# Altium footprint library 400389.PcbLib: 113 footprints (part 5 of 8)
Each footprint in its own frame and in the unit in brackets; x right, y up, seen from the top. Pads: shape width x height; smd on the part's side, far side on the other; paste and mask are expansions set on the pad; w line width, h text height; cw(c..) or ccw(c..) is an arc to the next point about the centre after c.
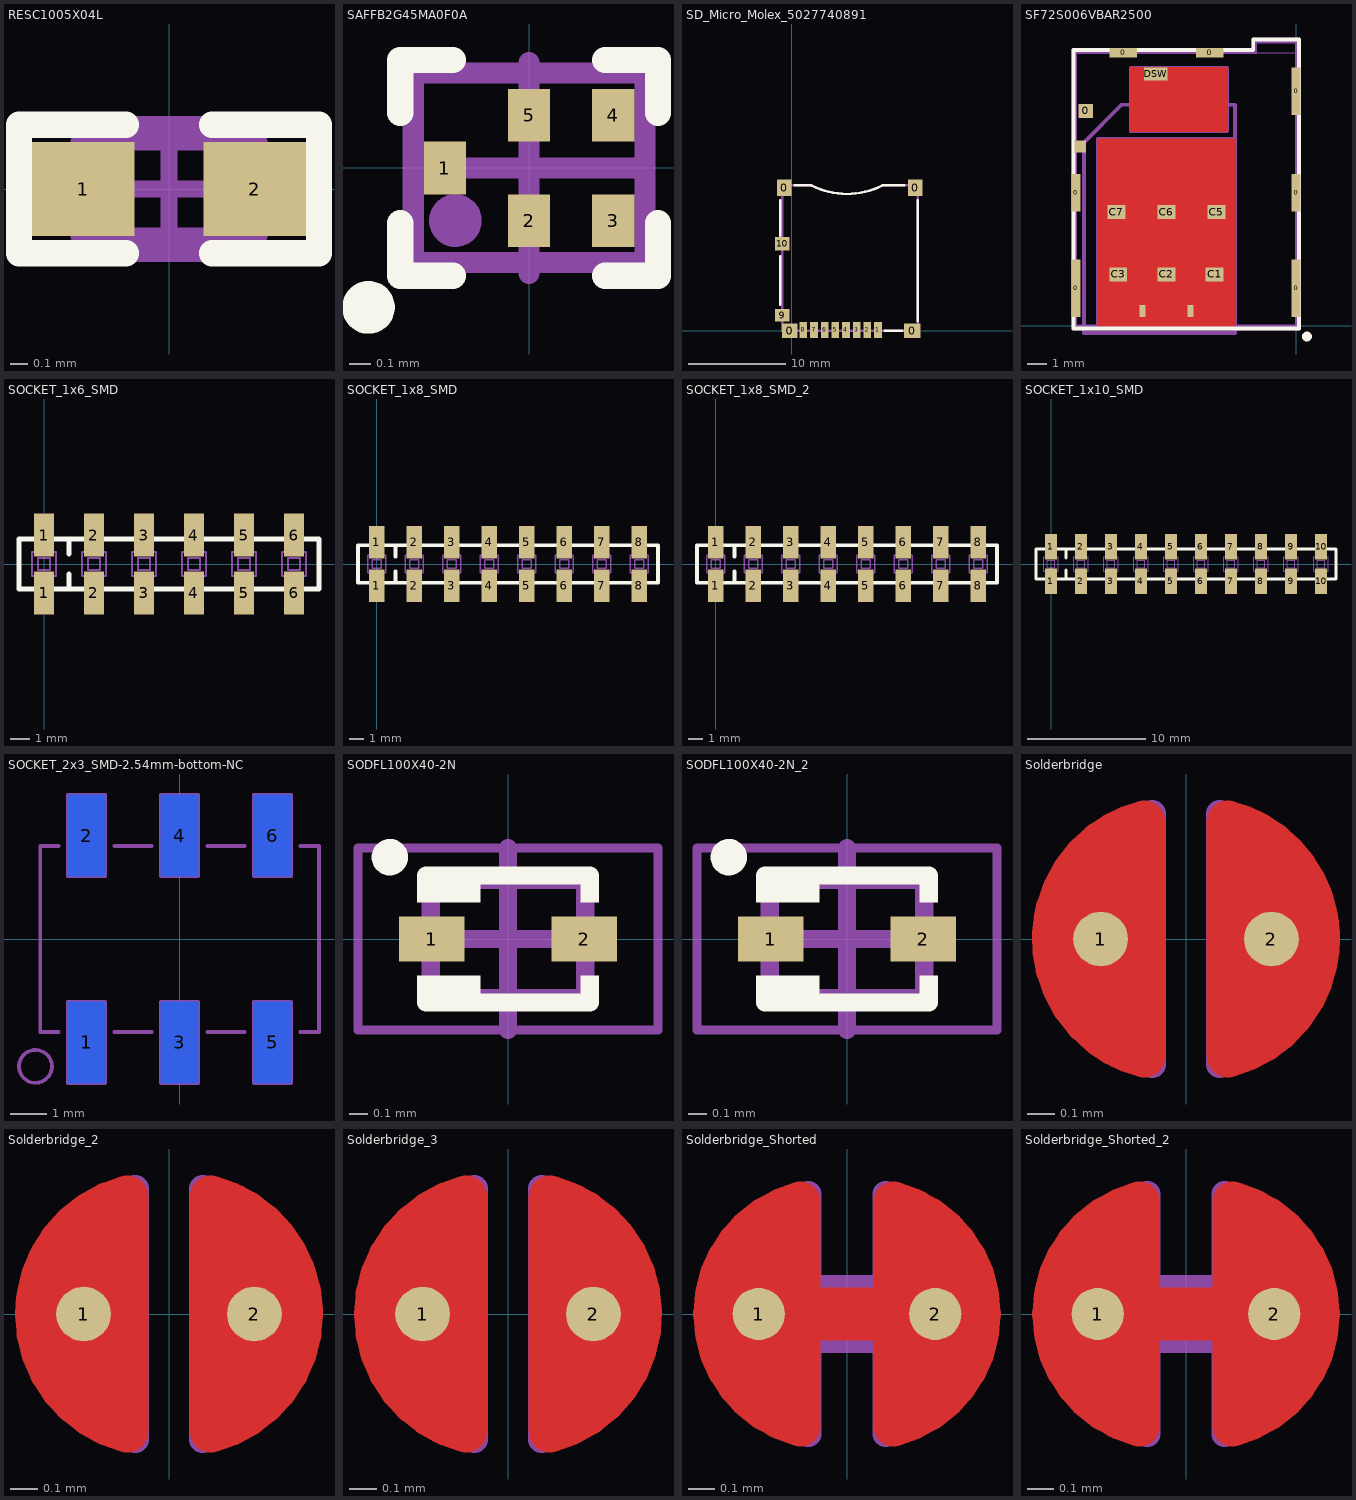
[diagram p4: the footprints below, top view; thin cyan lines are the x and y axes]

## RESC1005X04L [mm]
pads (2):
  rect 0.6x0.55 smd: 1(-0.5,0) 2(0.5,0)
Top Overlay:
  lines w0.152: -0.25,-0.375 -0.875,-0.375 -0.875,0.375 -0.25,0.375 ; 0.25,-0.375 0.875,-0.375 0.875,0.375 0.25,0.375
Mechanical 7:
  lines w0.1: -0.525,-0.275 -0.525,0.275 0.525,0.275 0.525,-0.275 -0.525,-0.275
  text ".Designator" at -0.432,-0.152 h0.3
Mechanical 15:
  lines w0.1: -0.275,0 0.275,0 ; 0,-0.275 0,0.275 ; -0.875,-0.375 0.875,-0.375 0.875,0.375 -0.875,0.375 -0.875,-0.375
3D body "User Library-res0402-1.step": height 0.3, standoff 0, extent -0.5,-0.25 0.5,0.25

## SAFFB2G45MA0F0A [mm]
pads (5):
  rect 0.2x0.25 smd: 1(-0.4,0) 2(0,-0.25) 3(0.4,-0.25) 4(0.4,0.25) 5(0,0.25)
Top Overlay:
  circle w0.15: c-0.762,-0.662 r0.05
  lines w0.125: -0.613,-0.262 -0.613,-0.512 -0.362,-0.512 ; -0.613,0.262 -0.613,0.512 -0.362,0.512 ; 0.362,-0.512 0.613,-0.512 0.613,-0.262 ; 0.362,0.512 0.613,0.512 0.613,0.262
Mechanical 7:
  circle w0.15: c-0.35,-0.25 r0.05
  lines w0.1: -0.55,-0.45 -0.55,0.45 0.55,0.45 0.55,-0.45 -0.55,-0.45
  text ".Designator" at -0.4,0 h0.3
Mechanical 15:
  lines w0.05: -0.55,-0.45 0.55,-0.45 0.55,0.45 -0.55,0.45 -0.55,-0.45
  lines w0.1: -0.5,0 0.5,0 ; 0,-0.5 0,0.5
3D body: height 0.5, standoff 0, extent -0.55,-0.45 0.55,0.45

## SD_Micro_Molex_5027740891 [mm]
pads (14):
  rect 1.5x1.7 smd: 0(-0.75,14.77) 0(12.75,14.77)
  rect 1.6x1.5 smd: 0(-0.21,0)
  rect 1.7x1.5 smd: 0(12.45,0)
  rect 0.8x1.68 smd: 1(8.9,0.08) 2(7.8,0.08) 3(6.7,0.08) 4(5.6,0.08) 5(4.5,0.08) 6(3.4,0.08) 7(2.3,0.08) 8(1.2,0.08)
  rect 1.5x1.3 smd: 9(-0.96,1.6)
  rect 1.5x1.4 smd: 10(-0.96,8.97)
Top Overlay:
  lines w0.254: -1.2,2.7 -1.2,7.7 ; -1.2,9.8 -1.2,13.5 ; 0.3,14.999 2,15 ; 2.091,14.981 ccw(c5.705,22.118) 9.311,14.977 ; 9.4,15 11.6,15 ; 9.6,0 11.4,0 ; 13,1 13,13.5
Mechanical 7:
  lines w0.254: 2.072,15 -1,15 -1,0 13,0 13,15 9.334,15 ; 2.091,14.981 ccw(c5.705,22.118) 9.311,14.977
  text ".designator" at 3.8,6.9 h1.52

## SF72S006VBAR2500 [mm]
pads (18):
  rect 0.45x2.9 smd: 0(-11.175,1.9) 0(0,1.9)
  rect 0.45x1.9 smd: 0(-11.175,6.75) 0(0,6.75)
  rect 0.75x0.7 smd: 0(-10.675,10.9)
  rect 1.4x0.5 smd: 0(-8.78,13.85) 0(-4.38,13.85)
  rect 0.3x0.6 smd: 0(-7.8,0.75) 0(-5.36,0.75)
  rect 0.45x2.4 smd: 0(0,11.9)
  rect 0.9x0.7 smd: C1(-4.14,2.6) C2(-6.58,2.6) C3(-9.02,2.6) C5(-4.04,5.77) C6(-6.58,5.77) C7(-9.12,5.77)
  rect 0.6x0.6 smd: CSW(-10.95,9.1)
  rect 1.2x0.65 smd: DSW(-7.13,12.775)
Top Layer:
  pour cut-out: -8.407,13.106 -3.48,13.106 -3.48,9.855 -8.407,9.855
  pour cut-out: -10.084,9.5 -3.073,9.5 -3.073,-0.025 -10.084,-0.025
Top Overlay:
  lines w0.2: -11.3,-0.15 0.15,-0.15 0.15,14.525 -2.175,14.525 -2.175,14 -11.3,14 -11.3,-0.15
  lines w0.25: 0.443,-0.486 ccw(c0.55,-0.55) 0.462,-0.462
Mechanical 7:
  lines w0.2: -3.124,11.214 -8.852,11.214 -10.77,9.296 -10.77,-0.381 -3.099,-0.381 -3.099,11.214 ; -11.3,-0.15 -11.3,14 -2.175,14 -2.175,14.525 0.15,14.525 0.15,-0.15 -11.3,-0.15
  text ".Designator" at -10.414,12.192 h1.02
Mechanical 13:
  lines w0.1: -11.175,0 0,0 0,14.375 -2.025,14.375 -2.025,13.85 -11.175,13.85 -11.175,0
Mechanical 15:
  lines w0.05: -11.175,0 0,0 0,13.85 -11.175,13.85 -11.175,0
  lines w0.15: -5.16,0 -10.08,0 -10.08,9.5 -3.08,9.5 -3.08,0 ; -8.4,9.85 -8.4,13.1 -3.48,13.1 -3.48,9.85 -8.4,9.85
  text "NO VIA" at -8.128,11.938 h0.8
  text "NO VIA" at -8.93,7.84 h0.8
  text "NO TRACE" at -8.89,10.668 h0.8
  text "NO TRACE" at -9.652,6.604 h0.8
3D body "K3D-SF72S006VBA-V2_JAE_Proprietary.STEP": height 1.25, standoff 0, extent -11.2,0.05 0.02,14.4

## SOCKET_1x6_SMD [mm]
pads (12):
  rect 1.02x2.19 smd: 1(0,-1.465) 1(0,1.465) 2(2.54,-1.465) 2(2.54,1.465) 3(5.08,-1.465) 3(5.08,1.465) 4(7.62,-1.465) 4(7.62,1.465) 5(10.16,-1.465) 5(10.16,1.465) 6(12.7,1.465) 6(12.7,-1.465)
Top Overlay:
  lines w0.254: 1.27,-1.27 1.27,-0.508 ; 1.27,0.508 1.27,1.27 ; -1.27,-1.27 13.97,-1.27 13.97,1.27 -1.27,1.27 -1.27,-1.27
Mechanical 7:
  lines w0.1: -0.35,-1.27 -0.35,-1.812 ccw(c0,-1.812) 0.35,-1.812 0.35,-1.27 ; 2.19,1.27 2.19,1.812 cw(c2.54,1.812) 2.89,1.812 2.89,1.27 ; 4.73,-1.27 4.73,-1.812 ccw(c5.08,-1.812) 5.43,-1.812 5.43,-1.27 ; 7.27,1.27 7.27,1.812 cw(c7.62,1.812) 7.97,1.812 7.97,1.27 ; 9.81,-1.27 9.81,-1.812 ccw(c10.16,-1.812) 10.51,-1.812 10.51,-1.27 ; 12.35,1.27 12.35,1.812 cw(c12.7,1.812) 13.05,1.812 13.05,1.27 ; -1.27,-1.27 -1.27,1.27 13.97,1.27 13.97,-1.27 -1.27,-1.27 ; -0.6,-0.6 -0.6,0.6 0.6,0.6 0.6,-0.6 -0.6,-0.6 ; -0.3,-0.3 -0.3,0.3 0.3,0.3 0.3,-0.3 -0.3,-0.3 ; 1.94,-0.6 1.94,0.6 3.14,0.6 3.14,-0.6 1.94,-0.6 ; 2.24,-0.3 2.24,0.3 2.84,0.3 2.84,-0.3 2.24,-0.3 ; 4.48,-0.6 4.48,0.6 5.68,0.6 5.68,-0.6 4.48,-0.6 ; 4.78,-0.3 4.78,0.3 5.38,0.3 5.38,-0.3 4.78,-0.3 ; 7.02,-0.6 7.02,0.6 8.22,0.6 8.22,-0.6 7.02,-0.6 ; 7.32,-0.3 7.32,0.3 7.92,0.3 7.92,-0.3 7.32,-0.3 ; 9.56,-0.6 9.56,0.6 10.76,0.6 10.76,-0.6 9.56,-0.6 ; 9.86,-0.3 9.86,0.3 10.46,0.3 10.46,-0.3 9.86,-0.3 ; 12.1,-0.6 12.1,0.6 13.3,0.6 13.3,-0.6 12.1,-0.6 ; 12.4,-0.3 12.4,0.3 13,0.3 13,-0.3 12.4,-0.3
  text ".Designator" at 0.77,-0.2 h0.38
3D body "Samtec-SSM-106-L-SV.step": height 7.47, standoff -0.03, extent -1.27,-2.286 13.97,2.286

## SOCKET_1x8_SMD [mm]
pads (16):
  rect 1.02x2.19 smd: 1(0,-1.465) 1(0,1.465) 2(2.54,-1.465) 2(2.54,1.465) 3(5.08,-1.465) 3(5.08,1.465) 4(7.62,-1.465) 4(7.62,1.465) 5(10.16,-1.465) 5(10.16,1.465) 6(12.7,1.465) 6(12.7,-1.465) 7(15.24,-1.465) 7(15.24,1.465) 8(17.78,-1.465) 8(17.78,1.465)
Top Overlay:
  lines w0.254: 1.27,-1.27 1.27,-0.508 ; 1.27,0.508 1.27,1.27 ; -1.27,-1.27 19.05,-1.27 19.05,1.27 -1.27,1.27 -1.27,-1.27
Mechanical 7:
  lines w0.1: -0.35,-1.27 -0.35,-1.812 ccw(c0,-1.812) 0.35,-1.812 0.35,-1.27 ; 2.19,1.27 2.19,1.812 cw(c2.54,1.812) 2.89,1.812 2.89,1.27 ; 4.73,-1.27 4.73,-1.812 ccw(c5.08,-1.812) 5.43,-1.812 5.43,-1.27 ; 7.27,1.27 7.27,1.812 cw(c7.62,1.812) 7.97,1.812 7.97,1.27 ; 9.81,-1.27 9.81,-1.812 ccw(c10.16,-1.812) 10.51,-1.812 10.51,-1.27 ; 12.35,1.27 12.35,1.812 cw(c12.7,1.812) 13.05,1.812 13.05,1.27 ; 14.89,-1.27 14.89,-1.812 ccw(c15.24,-1.812) 15.59,-1.812 15.59,-1.27 ; 17.43,1.27 17.43,1.812 cw(c17.78,1.812) 18.13,1.812 18.13,1.27 ; -1.27,-1.27 19.05,-1.27 19.05,1.27 -1.27,1.27 -1.27,-1.27 ; -0.6,-0.6 0.6,-0.6 0.6,0.6 -0.6,0.6 -0.6,-0.6 ; -0.3,-0.3 0.3,-0.3 0.3,0.3 -0.3,0.3 -0.3,-0.3 ; 1.94,-0.6 3.14,-0.6 3.14,0.6 1.94,0.6 1.94,-0.6 ; 2.24,-0.3 2.84,-0.3 2.84,0.3 2.24,0.3 2.24,-0.3 ; 4.48,-0.6 5.68,-0.6 5.68,0.6 4.48,0.6 4.48,-0.6 ; 4.78,-0.3 5.38,-0.3 5.38,0.3 4.78,0.3 4.78,-0.3 ; 7.02,-0.6 8.22,-0.6 8.22,0.6 7.02,0.6 7.02,-0.6 ; 7.32,-0.3 7.92,-0.3 7.92,0.3 7.32,0.3 7.32,-0.3 ; 9.56,-0.6 10.76,-0.6 10.76,0.6 9.56,0.6 9.56,-0.6 ; 9.86,-0.3 10.46,-0.3 10.46,0.3 9.86,0.3 9.86,-0.3 ; 12.1,-0.6 13.3,-0.6 13.3,0.6 12.1,0.6 12.1,-0.6 ; 12.4,-0.3 13,-0.3 13,0.3 12.4,0.3 12.4,-0.3 ; 14.64,-0.6 15.84,-0.6 15.84,0.6 14.64,0.6 14.64,-0.6 ; 14.94,-0.3 15.54,-0.3 15.54,0.3 14.94,0.3 14.94,-0.3 ; 17.18,-0.6 18.38,-0.6 18.38,0.6 17.18,0.6 17.18,-0.6 ; 17.48,-0.3 18.08,-0.3 18.08,0.3 17.48,0.3 17.48,-0.3
  text ".Designator" at 0.77,-0.2 h0.38
3D body "Samtec-SSM-108-L-SV.step": height 7.47, standoff -0.03, extent -1.27,-2.286 19.05,2.286

## SOCKET_1x8_SMD_2 [mm]
pads (16):
  rect 1.02x2.19 smd: 1(0,-1.465) 1(0,1.465) 2(2.54,-1.465) 2(2.54,1.465) 3(5.08,-1.465) 3(5.08,1.465) 4(7.62,-1.465) 4(7.62,1.465) 5(10.16,-1.465) 5(10.16,1.465) 6(12.7,1.465) 6(12.7,-1.465) 7(15.24,-1.465) 7(15.24,1.465) 8(17.78,-1.465) 8(17.78,1.465)
Top Overlay:
  lines w0.254: 1.27,-1.27 1.27,-0.508 ; 1.27,0.508 1.27,1.27 ; -1.27,-1.27 19.05,-1.27 19.05,1.27 -1.27,1.27 -1.27,-1.27
Mechanical 7:
  lines w0.1: -0.35,-1.27 -0.35,-1.812 ccw(c0,-1.812) 0.35,-1.812 0.35,-1.27 ; 2.19,1.27 2.19,1.812 cw(c2.54,1.812) 2.89,1.812 2.89,1.27 ; 4.73,-1.27 4.73,-1.812 ccw(c5.08,-1.812) 5.43,-1.812 5.43,-1.27 ; 7.27,1.27 7.27,1.812 cw(c7.62,1.812) 7.97,1.812 7.97,1.27 ; 9.81,-1.27 9.81,-1.812 ccw(c10.16,-1.812) 10.51,-1.812 10.51,-1.27 ; 12.35,1.27 12.35,1.812 cw(c12.7,1.812) 13.05,1.812 13.05,1.27 ; 14.89,-1.27 14.89,-1.812 ccw(c15.24,-1.812) 15.59,-1.812 15.59,-1.27 ; 17.43,1.27 17.43,1.812 cw(c17.78,1.812) 18.13,1.812 18.13,1.27 ; -1.27,-1.27 19.05,-1.27 19.05,1.27 -1.27,1.27 -1.27,-1.27 ; -0.6,-0.6 0.6,-0.6 0.6,0.6 -0.6,0.6 -0.6,-0.6 ; -0.3,-0.3 0.3,-0.3 0.3,0.3 -0.3,0.3 -0.3,-0.3 ; 1.94,-0.6 3.14,-0.6 3.14,0.6 1.94,0.6 1.94,-0.6 ; 2.24,-0.3 2.84,-0.3 2.84,0.3 2.24,0.3 2.24,-0.3 ; 4.48,-0.6 5.68,-0.6 5.68,0.6 4.48,0.6 4.48,-0.6 ; 4.78,-0.3 5.38,-0.3 5.38,0.3 4.78,0.3 4.78,-0.3 ; 7.02,-0.6 8.22,-0.6 8.22,0.6 7.02,0.6 7.02,-0.6 ; 7.32,-0.3 7.92,-0.3 7.92,0.3 7.32,0.3 7.32,-0.3 ; 9.56,-0.6 10.76,-0.6 10.76,0.6 9.56,0.6 9.56,-0.6 ; 9.86,-0.3 10.46,-0.3 10.46,0.3 9.86,0.3 9.86,-0.3 ; 12.1,-0.6 13.3,-0.6 13.3,0.6 12.1,0.6 12.1,-0.6 ; 12.4,-0.3 13,-0.3 13,0.3 12.4,0.3 12.4,-0.3 ; 14.64,-0.6 15.84,-0.6 15.84,0.6 14.64,0.6 14.64,-0.6 ; 14.94,-0.3 15.54,-0.3 15.54,0.3 14.94,0.3 14.94,-0.3 ; 17.18,-0.6 18.38,-0.6 18.38,0.6 17.18,0.6 17.18,-0.6 ; 17.48,-0.3 18.08,-0.3 18.08,0.3 17.48,0.3 17.48,-0.3
  text ".Designator" at 0.77,-0.2 h0.38
3D body "Samtec-SSM-108-L-SV.step": height 7.47, standoff -0.03, extent -1.27,-2.286 19.05,2.286

## SOCKET_1x10_SMD [mm]
pads (20):
  rect 1.02x2.19 smd: 1(0,-1.465) 1(0,1.465) 2(2.54,-1.465) 2(2.54,1.465) 3(5.08,-1.465) 3(5.08,1.465) 4(7.62,-1.465) 4(7.62,1.465) 5(10.16,-1.465) 5(10.16,1.465) 6(12.7,-1.465) 6(12.7,1.465) 7(15.24,-1.465) 7(15.24,1.465) 8(17.78,-1.465) 8(17.78,1.465) 9(20.32,-1.465) 9(20.32,1.465) 10(22.86,-1.465) 10(22.86,1.465)
Top Overlay:
  lines w0.254: 1.27,-1.27 1.27,-0.508 ; 1.27,0.508 1.27,1.27 ; -1.27,-1.27 24.13,-1.27 24.13,1.27 -1.27,1.27 -1.27,-1.27
Mechanical 7:
  lines w0.1: -0.35,-1.27 -0.35,-1.812 ccw(c0,-1.812) 0.35,-1.812 0.35,-1.27 ; 2.19,1.27 2.19,1.812 cw(c2.54,1.812) 2.89,1.812 2.89,1.27 ; 4.73,-1.27 4.73,-1.812 ccw(c5.08,-1.812) 5.43,-1.812 5.43,-1.27 ; 7.27,1.27 7.27,1.812 cw(c7.62,1.812) 7.97,1.812 7.97,1.27 ; 9.81,-1.27 9.81,-1.812 ccw(c10.16,-1.812) 10.51,-1.812 10.51,-1.27 ; 12.35,1.27 12.35,1.812 cw(c12.7,1.812) 13.05,1.812 13.05,1.27 ; 14.89,-1.27 14.89,-1.812 ccw(c15.24,-1.812) 15.59,-1.812 15.59,-1.27 ; 17.43,1.27 17.43,1.812 cw(c17.78,1.812) 18.13,1.812 18.13,1.27 ; 19.97,-1.27 19.97,-1.812 ccw(c20.32,-1.812) 20.67,-1.812 20.67,-1.27 ; 22.51,1.27 22.51,1.812 cw(c22.86,1.812) 23.21,1.812 23.21,1.27 ; -1.27,-1.27 -1.27,1.27 24.13,1.27 24.13,-1.27 -1.27,-1.27 ; -0.6,-0.6 -0.6,0.6 0.6,0.6 0.6,-0.6 -0.6,-0.6 ; -0.3,-0.3 -0.3,0.3 0.3,0.3 0.3,-0.3 -0.3,-0.3 ; 1.94,-0.6 1.94,0.6 3.14,0.6 3.14,-0.6 1.94,-0.6 ; 2.24,-0.3 2.24,0.3 2.84,0.3 2.84,-0.3 2.24,-0.3 ; 4.48,-0.6 4.48,0.6 5.68,0.6 5.68,-0.6 4.48,-0.6 ; 4.78,-0.3 4.78,0.3 5.38,0.3 5.38,-0.3 4.78,-0.3 ; 7.02,-0.6 7.02,0.6 8.22,0.6 8.22,-0.6 7.02,-0.6 ; 7.32,-0.3 7.32,0.3 7.92,0.3 7.92,-0.3 7.32,-0.3 ; 9.56,-0.6 9.56,0.6 10.76,0.6 10.76,-0.6 9.56,-0.6 ; 9.86,-0.3 9.86,0.3 10.46,0.3 10.46,-0.3 9.86,-0.3 ; 12.1,-0.6 12.1,0.6 13.3,0.6 13.3,-0.6 12.1,-0.6 ; 12.4,-0.3 12.4,0.3 13,0.3 13,-0.3 12.4,-0.3 ; 14.64,-0.6 14.64,0.6 15.84,0.6 15.84,-0.6 14.64,-0.6 ; 14.94,-0.3 14.94,0.3 15.54,0.3 15.54,-0.3 14.94,-0.3 ; 17.18,-0.6 17.18,0.6 18.38,0.6 18.38,-0.6 17.18,-0.6 ; 17.48,-0.3 17.48,0.3 18.08,0.3 18.08,-0.3 17.48,-0.3 ; 19.72,-0.6 19.72,0.6 20.92,0.6 20.92,-0.6 19.72,-0.6 ; 20.02,-0.3 20.02,0.3 20.62,0.3 20.62,-0.3 20.02,-0.3 ; 22.26,-0.6 22.26,0.6 23.46,0.6 23.46,-0.6 22.26,-0.6 ; 22.56,-0.3 22.56,0.3 23.16,0.3 23.16,-0.3 22.56,-0.3
  text ".Designator" at 0.77,-0.2 h0.38
3D body "Samtec-SSM-110-L-SV.step": height 7.47, standoff -0.03, extent -1.27,-2.286 24.13,2.286

## SOCKET_2x3_SMD-2.54mm-bottom-NC [mm]
pads (6):
  rect 1.02x2.22 smd far side: 1(-2.54,-2.825) 2(-2.54,2.825) 3(0,-2.825) 4(0,2.825) 5(2.54,-2.825) 6(2.54,2.825)
Bottom Overlay:
  circle w0.508: c-3.936,-3.48 r0.254
  lines w0.254: -3.33,-2.54 -3.81,-2.54 -3.81,2.54 -3.33,2.54 ; -1.77,-2.54 -0.78,-2.54 ; -1.77,2.54 -0.78,2.54 ; 0.78,-2.54 1.77,-2.54 ; 0.78,2.54 1.77,2.54 ; 3.33,-2.54 3.81,-2.54 3.81,2.54 3.33,2.54
Mechanical 8:
  circle w0.1: c-3.936,-3.48 r0.45
  lines w0.1: -3.302,-2.54 -3.81,-2.54 -3.81,2.54 -3.302,2.54 ; -1.778,-2.54 -0.762,-2.54 ; -1.778,2.54 -0.762,2.54 ; 0.762,-2.54 1.778,-2.54 ; 0.762,2.54 1.778,2.54 ; 3.302,-2.54 3.81,-2.54 3.81,2.54 3.302,2.54 ; -3.05,-3.935 -2.03,-3.935 -2.03,-1.715 -3.05,-1.715 -3.05,-3.935 ; -3.05,1.715 -3.05,3.935 -2.03,3.935 -2.03,1.715 -3.05,1.715 ; -0.51,-3.935 0.51,-3.935 0.51,-1.715 -0.51,-1.715 -0.51,-3.935 ; -0.51,1.715 0.51,1.715 0.51,3.935 -0.51,3.935 -0.51,1.715 ; 2.03,-3.935 3.05,-3.935 3.05,-1.715 2.03,-1.715 2.03,-3.935 ; 2.03,1.715 3.05,1.715 3.05,3.935 2.03,3.935 2.03,1.715
  text ".Designator" at -3.226,0.178 h0.38

## SODFL100X40-2N [mm]
pads (2):
  rect 0.36x0.25 smd: 1(-0.42,0) 2(0.42,0)
Top Overlay:
  circle w0.1: c-0.65,0.45 r0.05
  rectangle: -0.5,0.2 -0.15,0.325
  rectangle: -0.5,-0.35 -0.15,-0.2
  rectangle: 0.4,-0.35 0.5,-0.2
  rectangle: 0.4,0.2 0.5,0.35
  lines w0.1: -0.45,-0.3 -0.45,-0.35 0.45,-0.35 0.45,-0.3 ; -0.45,0.3 -0.45,0.35 0.45,0.35 0.45,0.3
Mechanical 7:
  lines w0.1: -0.425,-0.325 0.425,-0.325 0.425,0.325 -0.425,0.325 -0.425,-0.325
  text ".Designator" at -0.724,-0.177 h0.38
Mechanical 15:
  lines w0.05: -0.825,-0.5 -0.825,0.5 0.825,0.5 0.825,-0.5 -0.825,-0.5
  lines w0.1: -0.5,0 0.5,0 ; 0,-0.5 0,0.5
3D body "SODFL100X40-2N.step": height 0.4, standoff 0, extent -0.5,-0.325 0.5,0.325

## SODFL100X40-2N_2 [mm]
pads (2):
  rect 0.36x0.25 smd: 1(-0.42,0) 2(0.42,0)
Top Overlay:
  circle w0.1: c-0.65,0.45 r0.05
  rectangle: -0.5,0.2 -0.15,0.325
  rectangle: -0.5,-0.35 -0.15,-0.2
  rectangle: 0.4,-0.35 0.5,-0.2
  rectangle: 0.4,0.2 0.5,0.35
  lines w0.1: -0.45,-0.3 -0.45,-0.35 0.45,-0.35 0.45,-0.3 ; -0.45,0.3 -0.45,0.35 0.45,0.35 0.45,0.3
Mechanical 7:
  lines w0.1: -0.425,-0.325 0.425,-0.325 0.425,0.325 -0.425,0.325 -0.425,-0.325
  text ".Designator" at -0.724,-0.177 h0.38
Mechanical 15:
  lines w0.05: -0.825,-0.5 -0.825,0.5 0.825,0.5 0.825,-0.5 -0.825,-0.5
  lines w0.1: -0.5,0 0.5,0 ; 0,-0.5 0,0.5
3D body "SODFL100X40-2N.step": height 0.4, standoff 0, extent -0.5,-0.325 0.5,0.325

## Solderbridge [mm]
pads (2):
  round 0.2 smd paste-10: 1(-0.312,0) 2(0.312,0)
Top Layer:
  region: -0.077,-0.432 -0.152,-0.505 -0.271,-0.467 -0.335,-0.424 -0.409,-0.351 -0.462,-0.292 -0.521,-0.193 -0.549,-0.099 -0.544,0.122 -0.518,0.193 -0.434,0.33 -0.351,0.411 -0.259,0.469 -0.157,0.5 -0.107,0.483 -0.077,0.43
  region: 0.077,0.432 0.152,0.505 0.271,0.467 0.335,0.424 0.409,0.351 0.462,0.292 0.521,0.193 0.549,0.099 0.544,-0.122 0.518,-0.193 0.434,-0.33 0.351,-0.411 0.259,-0.469 0.157,-0.5 0.107,-0.483 0.077,-0.43
  lines w0.152: -0.153,-0.431 cw(c-0.042,0) -0.313,-0.353 cw(c-0.042,0) -0.473,-0.109 cw(c-0.042,0) -0.487,0.017 cw(c-0.042,0) -0.473,0.109 cw(c-0.042,0) -0.312,0.353 cw(c-0.042,0) -0.153,0.431 ; 0.153,-0.431 ccw(c0.042,0) 0.479,-0.085 ccw(c0.042,0) 0.487,0 ccw(c0.042,0) 0.487,0.017 ccw(c0.042,0) 0.479,0.085 ccw(c0.042,0) 0.312,0.353 ccw(c0.042,0) 0.153,0.431
Top Solder:
  circle w0.61: c-0.003,0 r0.279
Mechanical 7:
  lines w0.1: -0.123,-0.459 cw(c-0.042,0) -0.123,0.459 -0.123,-0.459 ; 0.123,-0.459 ccw(c0.042,0) 0.123,0.459 0.123,-0.459
  text ".Designator" at -0.635,0.635 h0.38

## Solderbridge_2 [mm]
pads (2):
  round 0.2 smd paste-10: 1(-0.312,0) 2(0.312,0)
Top Layer:
  region: -0.077,-0.432 -0.152,-0.505 -0.271,-0.467 -0.335,-0.424 -0.409,-0.351 -0.462,-0.292 -0.521,-0.193 -0.549,-0.099 -0.544,0.122 -0.518,0.193 -0.434,0.33 -0.351,0.411 -0.259,0.469 -0.157,0.5 -0.107,0.483 -0.077,0.43
  region: 0.077,0.432 0.152,0.505 0.271,0.467 0.335,0.424 0.409,0.351 0.462,0.292 0.521,0.193 0.549,0.099 0.544,-0.122 0.518,-0.193 0.434,-0.33 0.351,-0.411 0.259,-0.469 0.157,-0.5 0.107,-0.483 0.077,-0.43
  lines w0.152: -0.153,-0.431 cw(c-0.042,0) -0.487,0 cw(c-0.042,0) -0.482,0.064 cw(c-0.042,0) -0.153,0.431 ; 0.153,-0.431 ccw(c0.042,0) 0.487,0 ccw(c0.042,0) 0.487,0.011 ccw(c0.042,0) 0.153,0.431
Top Solder:
  circle w0.61: c-0.003,0 r0.279
Mechanical 7:
  lines w0.1: -0.123,-0.459 cw(c-0.042,0) -0.123,0.459 -0.123,-0.459 ; 0.123,-0.459 ccw(c0.042,0) 0.123,0.459 0.123,-0.459
  text ".Designator" at -0.635,0.635 h0.38

## Solderbridge_3 [mm]
pads (2):
  round 0.2 smd paste-10: 1(-0.312,0) 2(0.312,0)
Top Layer:
  region: 0.077,0.432 0.152,0.505 0.271,0.467 0.335,0.424 0.409,0.351 0.462,0.292 0.521,0.193 0.549,0.099 0.544,-0.122 0.518,-0.193 0.434,-0.33 0.351,-0.411 0.259,-0.469 0.157,-0.5 0.107,-0.483 0.077,-0.43
  region: -0.077,-0.432 -0.152,-0.505 -0.271,-0.467 -0.335,-0.424 -0.409,-0.351 -0.462,-0.292 -0.521,-0.193 -0.549,-0.099 -0.544,0.122 -0.518,0.193 -0.434,0.33 -0.351,0.411 -0.259,0.469 -0.157,0.5 -0.107,0.483 -0.077,0.43
  lines w0.152: -0.153,-0.431 cw(c-0.042,0) -0.487,0 cw(c-0.042,0) -0.153,0.431 ; 0.153,-0.431 ccw(c0.042,0) 0.468,-0.13 ccw(c0.042,0) 0.153,0.431
Top Solder:
  circle w0.61: c-0.003,0 r0.279
Mechanical 7:
  lines w0.1: -0.123,-0.459 cw(c-0.042,0) -0.123,0.459 -0.123,-0.459 ; 0.123,-0.459 ccw(c0.042,0) 0.123,0.459 0.123,-0.459
  text ".Designator" at -0.635,0.635 h0.38

## Solderbridge_Shorted [mm]
pads (2):
  round 0.2 smd paste-10: 1(-0.338,0) 2(0.338,0)
Top Layer:
  region: 0.102,0.432 0.178,0.505 0.296,0.467 0.361,0.424 0.434,0.351 0.488,0.292 0.546,0.193 0.574,0.099 0.569,-0.122 0.544,-0.193 0.46,-0.33 0.376,-0.411 0.284,-0.469 0.183,-0.5 0.132,-0.483 0.102,-0.43
  region: -0.102,-0.432 -0.178,-0.505 -0.296,-0.467 -0.361,-0.424 -0.434,-0.351 -0.488,-0.292 -0.546,-0.193 -0.574,-0.099 -0.569,0.122 -0.544,0.193 -0.46,0.33 -0.376,0.411 -0.284,0.469 -0.183,0.5 -0.132,0.483 -0.102,0.43
  lines w0.152: -0.178,-0.431 cw(c-0.068,0) -0.178,0.431 ; 0.178,-0.431 ccw(c0.068,0) 0.178,0.431
  lines w0.203: -0.338,0 0.338,0
Top Solder:
  circle w0.61: c-0.028,0 r0.279
  circle w0.61: c0.028,0 r0.279
Mechanical 7:
  lines w0.1: -0.148,-0.459 cw(c-0.067,0) -0.148,0.459 -0.148,0.1 0.148,0.1 0.148,0.459 cw(c0.067,0) 0.148,-0.459 0.148,-0.1 -0.148,-0.1 -0.148,-0.459
  text ".Designator" at -0.635,0.635 h0.38

## Solderbridge_Shorted_2 [mm]
pads (2):
  round 0.2 smd paste-10: 1(-0.338,0) 2(0.338,0)
Top Layer:
  region: 0.102,0.432 0.178,0.505 0.296,0.467 0.361,0.424 0.434,0.351 0.488,0.292 0.546,0.193 0.574,0.099 0.569,-0.122 0.544,-0.193 0.46,-0.33 0.376,-0.411 0.284,-0.469 0.183,-0.5 0.132,-0.483 0.102,-0.43
  region: -0.102,-0.432 -0.178,-0.505 -0.296,-0.467 -0.361,-0.424 -0.434,-0.351 -0.488,-0.292 -0.546,-0.193 -0.574,-0.099 -0.569,0.122 -0.544,0.193 -0.46,0.33 -0.376,0.411 -0.284,0.469 -0.183,0.5 -0.132,0.483 -0.102,0.43
  lines w0.152: -0.178,-0.431 cw(c-0.068,0) -0.178,0.431 ; 0.178,-0.431 ccw(c0.068,0) 0.178,0.431
  lines w0.203: -0.338,0 0.338,0
Top Solder:
  circle w0.61: c-0.028,0 r0.279
  circle w0.61: c0.028,0 r0.279
Mechanical 7:
  lines w0.1: -0.148,-0.459 cw(c-0.067,0) -0.148,0.459 -0.148,0.1 0.148,0.1 0.148,0.459 cw(c0.067,0) 0.148,-0.459 0.148,-0.1 -0.148,-0.1 -0.148,-0.459
  text ".Designator" at -0.635,0.635 h0.38